# Altium footprint library Inductors.PcbLib: 33 footprints (part 3 of 3)
Each footprint in its own frame and in the unit in brackets; x right, y up, seen from the top. Pads: shape width x height; smd on the part's side, far side on the other; paste and mask are expansions set on the pad; w line width, h text height; cw(c..) or ccw(c..) is an arc to the next point about the centre after c.
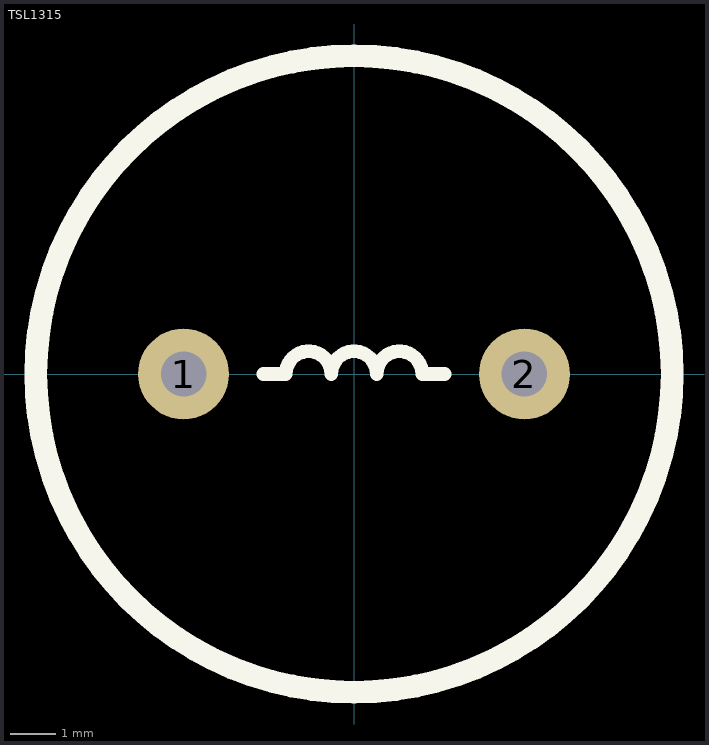
[diagram p2: the footprint, top view; thin cyan lines are the x and y axes]

## TSL1315 [mm]
pads (2):
  round 2 hole 1 mask+0.3: 1(-3.75,0) 2(3.75,0)
Top Overlay:
  circle w0.5: c0,0 r7
  lines w0.3: -2,0 -1.5,0 cw(c-1,0) -0.5,0 cw(c0,0) 0.5,0 cw(c1,0) 1.5,0 2,0
3D body "TSL1315.step": height 16.76, standoff -4.98, extent -7,-7 7.015,7